# Altium footprint library Power_Lib_Altium.PcbLib: 383 footprints (part 23 of 24)
Each footprint in its own frame and in the unit in brackets; x right, y up, seen from the top. Pads: shape width x height; smd on the part's side, far side on the other; paste and mask are expansions set on the pad; w line width, h text height; cw(c..) or ccw(c..) is an arc to the next point about the centre after c.
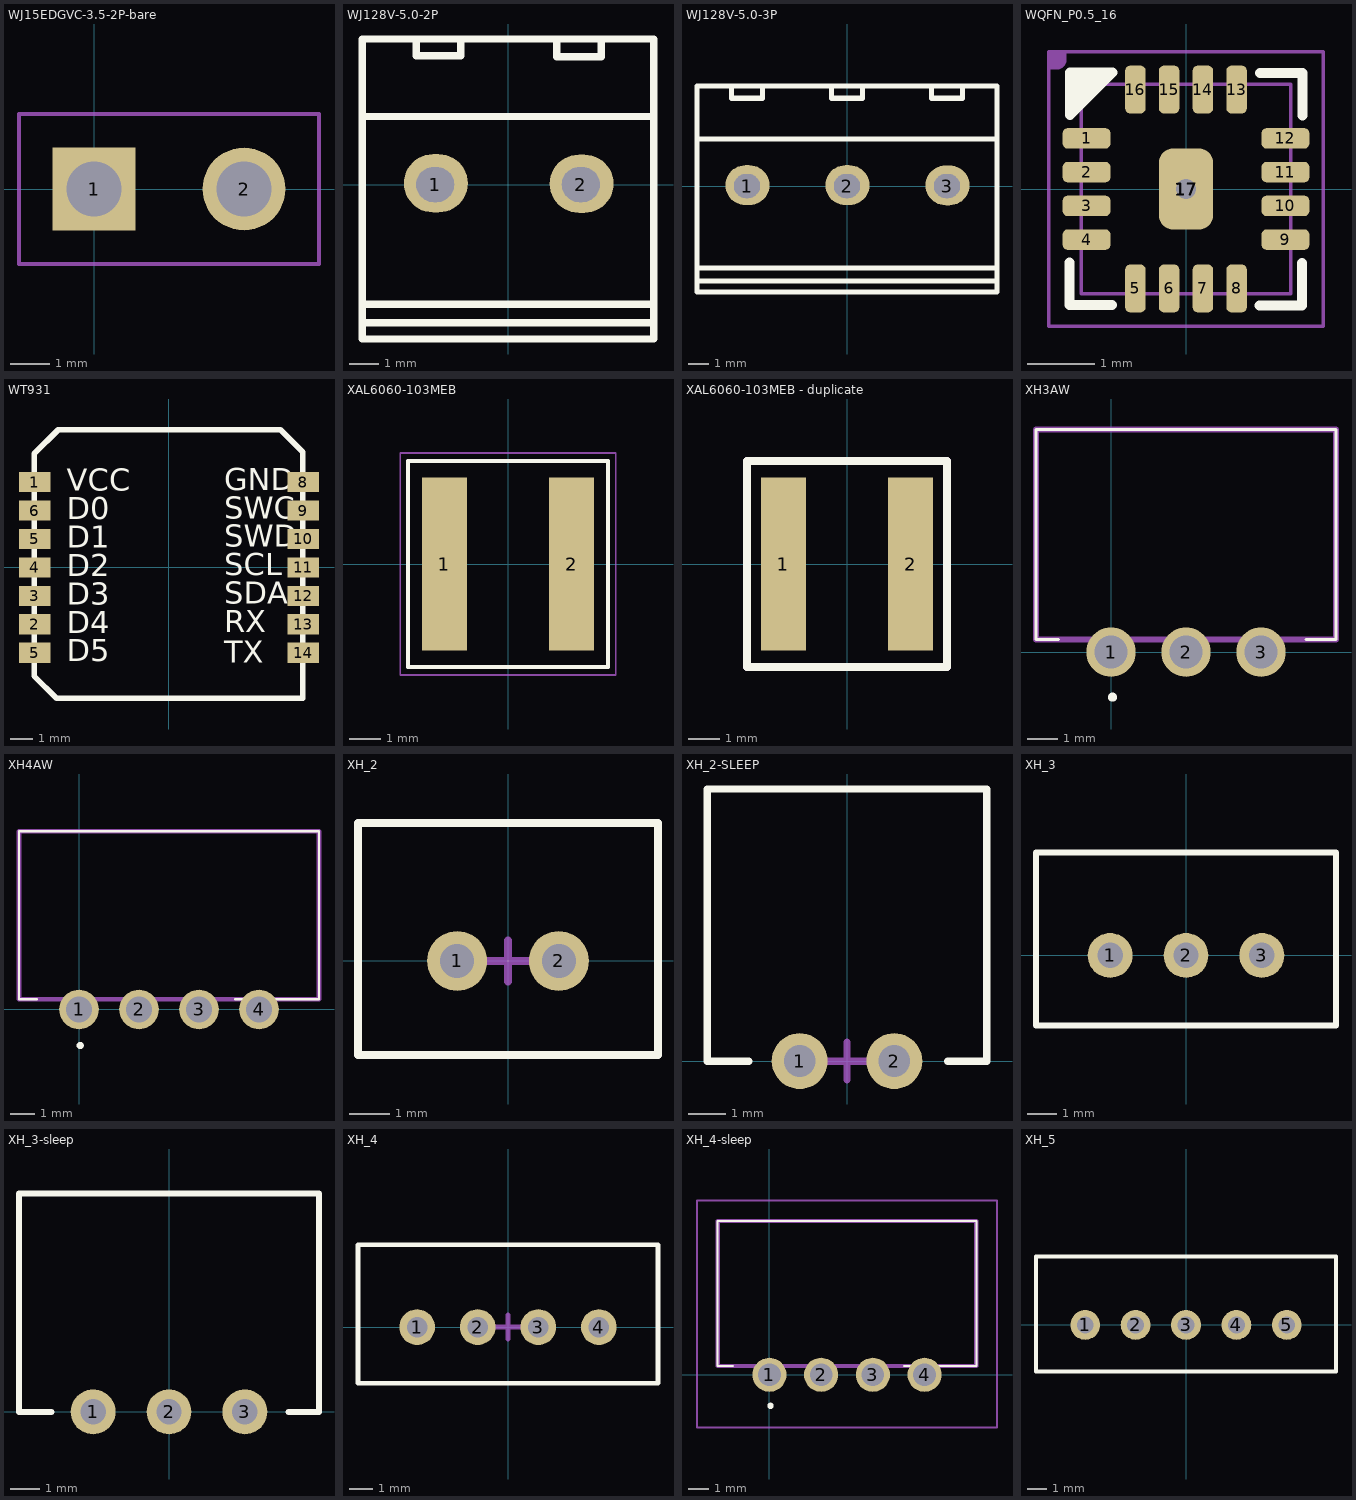
[diagram p22: the footprints below, top view; thin cyan lines are the x and y axes]

## WJ15EDGVC-3.5-2P-bare [mm]
pads (2):
  rect 2.1x2.1 hole 1.4: 1(0,0)
  round 2.1 hole 1.4: 2(3.81,0)
Mechanical 13:
  lines w0.1: -1.905,-1.905 5.715,-1.905 5.715,1.905 -1.905,1.905 -1.905,-1.905

## WJ128V-5.0-2P [mm]
pads (2):
  oval 2.2x2 hole 1.2 slot 1.3 at 0 deg copper offset 0.023,0.044: 1(-2.5,0)
  oval 2.2x2 hole 1.2 slot 1.3 at 0 deg copper offset 0.027,0.032: 2(2.5,0)
Top Overlay:
  lines w0.254: -5,-4.74 5,-4.74 ; -5,-4.11 5,-4.11 ; -5,2.34 5,2.34 ; -3.146,4.959 -3.146,4.419 -1.616,4.419 -1.616,4.959 ; 1.672,4.929 1.672,4.389 3.202,4.389 3.202,4.929 ; 5,-5.3 5,5 ; 5,-5.3 -5,-5.3 -5,5 5,5 ; 5,-5.3 5,5
3D body: height 0.25, standoff -20, extent 12.573,2.413 12.573,2.413
3D body: height 14.1, standoff 0, extent -5,-5.3 5,5
3D body: height 0.25, standoff -20, extent 12.573,2.413 12.573,2.413

## WJ128V-5.0-3P [mm]
pads (3):
  oval 2.2x2 hole 1.2 slot 1.3 at 0 deg copper offset 0.023,0.044: 1(-5,0) 2(0,0)
  oval 2.2x2 hole 1.2 slot 1.3 at 0 deg copper offset 0.027,0.032: 3(5,0)
Top Overlay:
  lines w0.254: -7.5,-4.11 7.5,-4.11 ; -7.5,2.34 7.5,2.34 ; -7.493,-4.74 7.5,-4.74 ; -5.765,4.929 -5.765,4.389 -4.235,4.389 -4.235,4.929 ; -0.765,4.929 -0.765,4.389 0.765,4.389 0.765,4.929 ; 4.235,4.929 4.235,4.389 5.765,4.389 5.765,4.929 ; 7.5,-5.3 7.5,5 ; 7.5,-5.3 -7.5,-5.3 -7.5,5 7.5,5 ; 7.5,-5.3 7.5,5
3D body: height 0.25, standoff -20, extent 15.073,2.413 15.073,2.413
3D body: height 14.1, standoff 0, extent -7.5,-5.3 7.5,5
3D body: height 0.25, standoff -20, extent 15.073,2.413 15.073,2.413

## WQFN_P0.5_16 [mil]
height 23.62
pads (18):
  rrect50% 28x12 smd: 1(-58,29.53) 2(-58,9.84) 3(-58,-9.84) 4(-58,-29.53) 9(58,-29.53) 10(58,-9.84) 11(58,9.84) 12(58,29.53)
  rrect50% 12x28 smd: 5(-29.53,-58) 6(-9.84,-58) 7(9.84,-58) 8(29.53,-58) 13(29.53,58) 14(9.84,58) 15(-9.84,58) 16(-29.53,58)
  rrect50% 31.5x47.24 smd: 17(0,0)
  round 15.75 hole 11.81: 17(0,0)
Top Overlay:
  region: -67.67,68 -43,68 -67.67,43.33
  lines w6: -68,-43 -68,-67.67 -43.33,-67.67 ; 43,-68 67.67,-68 67.67,-43.33 ; 43.33,67.67 68,67.67 68,43 ; -67.67,43.33 -67.67,68 -43,68 -67.67,43.33
Top Solder:
  rectangle: -72,-29.53 -44,29.53
  region: 29.53,-72 29.53,-44 -29.53,-44 -29.53,-72
  region: -29.53,72 -29.53,44 29.53,44 29.53,72
  region: 72,29.53 44,29.53 44,-29.53 72,-29.53
Mechanical 13:
  lines w2: -10,0 10,0 ; 0,-10 0,10 ; -61.02,-61.02 61.02,-61.02 61.02,61.02 -61.02,61.02 -61.02,-61.02
Mechanical 14:
  region: -80,80 -70,80 -70,75 -70,74.01 -70.76,72.17 -72.17,70.76 -74.01,70 -75,70 -80,70
  lines w2: -80,-80 -80,80 80,80 80,-80 -80,-80
3D body "QFN50P300X300X100-16N.step": height 39.37, standoff 0, extent -59.05,-59.05 59.06,59.06

## WT931 [mm]
pads (14):
  rect 1.4x0.9 smd: 1(-6,3.81) 2(-6,-2.54) 3(-6,-1.27) 4(-6,0) 5(-6,-3.81) 5(-6,1.27) 6(-6,2.54) 8(6,3.81) 9(6,2.54) 10(6,1.27) 11(6,0) 12(6,-1.27) 13(6,-2.54) 14(6,-3.81)
Top Overlay:
  lines w0.254: -6.025,-4.848 -5.025,-5.848 5.975,-5.848 5.975,5.152 4.975,6.152 -4.947,6.152 -6.025,5.074 -6.025,-4.848
  text "TX" at 2.468,-4.263 h1
  text "RX" at 2.468,-2.896 h1
  text "SDA" at 2.468,-1.626 h1
  text "SCL" at 2.468,-0.356 h1
  text "SWD" at 2.468,0.914 h1
  text "SWC" at 2.468,2.184 h1
  text "GND" at 2.468,3.454 h1
  text "D5" at -4.562,-4.202 h1
  text "D4" at -4.562,-2.932 h1
  text "D3" at -4.562,-1.662 h1
  text "D2" at -4.562,-0.392 h1
  text "D1" at -4.562,0.878 h1
  text "D0" at -4.562,2.148 h1
  text "VCC" at -4.562,3.418 h1
3D body: height 1.5, standoff 0, extent -5.985,-5.865 5.953,6.073

## XAL6060-103MEB [mm]
pads (2):
  rect 1.43x5.5 smd: 1(-2.02,0) 2(2.02,0)
Top Overlay:
  lines w0.127: -3.18,-3.28 3.18,-3.28 3.18,3.28 -3.18,3.28 -3.18,-3.28
Mechanical 13:
  lines w0.127: -3.18,-3.28 3.18,-3.28 3.18,3.28 -3.18,3.28 -3.18,-3.28
Mechanical 15:
  lines w0.05: -3.43,-3.53 -3.43,3.53 3.43,3.53 3.43,-3.53 -3.43,-3.53
3D body: height 6.1, standoff 0, extent -3.175,-3.264 3.175,3.264

## XAL6060-103MEB - duplicate [mm]
pads (2):
  rect 1.43x5.5 smd: 1(-2.02,0) 2(2.02,0)
Top Overlay:
  lines w0.254: -3.18,-3.28 -3.18,3.28 3.18,3.28 3.18,-3.28 -3.18,-3.28
Mechanical 13:
  lines w0.254: -3.18,-3.28 3.18,-3.28 3.18,3.28 -3.18,3.28 -3.18,-3.28

## XH3AW [mm]
pads (3):
  round 1.65 hole 1.1: 1(0,0) 2(2.5,0) 3(5,0)
Top Overlay:
  lines w0.1: -2.5,0.425 -2.5,7.425 ; -2.5,0.425 -2.5,7.425 ; -2.5,0.425 -1.75,0.425 -2.5,0.425 ; -2.5,7.425 7.5,7.425 ; -2.5,7.425 7.5,7.425 ; 7.5,0.425 6.5,0.425 7.5,0.425 ; 7.5,0.425 7.5,7.425 ; 7.5,0.425 7.5,7.425
  lines w0.2: 0,-1.5 ccw(c0.05,-1.5) 0.1,-1.5 ; 0,-1.5 cw(c0.05,-1.5) 0.1,-1.5 ; 0,-1.5 ccw(c0.05,-1.5) 0.1,-1.5
Mechanical 13:
  lines w0.2: -2.5,0.425 -2.5,7.425 7.5,7.425 7.5,0.425 -2.5,0.425
3D body "XH-3AW.stp": height 6, standoff -5, extent -2.5,-0.449 7.5,7.425

## XH4AW [mm]
pads (4):
  round 1.65 hole 1.1: 1(0,0) 2(2.5,0) 3(5,0) 4(7.5,0)
Top Overlay:
  lines w0.1: 8.75,0.425 6.5,0.425 10,0.425 10,7.425 -2.5,7.425 ; -2.5,0.425 -1.75,0.425 -2.5,0.425 ; -2.5,0.425 -2.5,7.425 ; -2.5,0.425 -2.5,7.425
  lines w0.2: 0,-1.5 ccw(c0.05,-1.5) 0.1,-1.5 ; 0,-1.5 cw(c0.05,-1.5) 0.1,-1.5 ; 0,-1.5 ccw(c0.05,-1.5) 0.1,-1.5
Mechanical 13:
  lines w0.2: -2.5,0.425 10,0.425 10,7.425 -2.5,7.425 -2.5,0.425
3D body "XH-3AW.stp": height 6, standoff -5, extent 0,-0.449 10,7.425
3D body "XH-3AW.stp": height 6, standoff -5, extent -2.5,-0.449 7.5,7.425

## XH_2 [mm]
pads (2):
  round 1.5 hole 0.85: 1(-1.27,0) 2(1.27,0)
Top Overlay:
  lines w0.2: -3.75,-2.35 3.75,-2.35 3.75,3.45 -3.75,3.45 -3.75,-2.35
Mechanical 15:
  lines w0.2: -0.508,0 0.508,0 ; 0,-0.508 0,0.508
3D body "XH_2.STEP": height 7.21, standoff -3.19, extent -3.75,-2.35 3.75,3.45

## XH_2-SLEEP [mm]
pads (2):
  round 1.5 hole 0.85: 1(-1.27,0) 2(1.27,0)
Top Overlay:
  lines w0.2: -3.75,0 -3.75,7.3 3.75,7.3 3.75,0 ; -3.7,0 -2.63,0 ; 2.7,0 3.7,0
Mechanical 15:
  lines w0.2: -0.508,0 0.508,0 ; 0,-0.508 0,0.508
3D body "JST-XH-2.5mm-2P.STEP": height 5.95, standoff -3.35, extent -3.75,-0.34 3.75,7.3

## XH_3 [mm]
pads (3):
  round 1.5 hole 0.85: 1(-2.54,0) 2(0,0) 3(2.54,0)
Top Overlay:
  lines w0.2: -5.02,-2.35 5.02,-2.35 5.02,3.45 -5.02,3.45 -5.02,-2.35
3D body "XH_3.STEP": height 7.21, standoff -3.19, extent -5.02,-2.35 5.02,3.45

## XH_3-sleep [mm]
pads (3):
  round 1.5 hole 0.85: 1(-2.54,0) 2(0,0) 3(2.54,0)
Top Overlay:
  lines w0.2: -5.02,0 -5.02,7.3 5.02,7.3 5.02,0 ; -5,0 -3.93,0 ; 4,0 5,0
3D body "JST-XH-2.5mm-3P.STEP": height 5.95, standoff -3.35, extent -5,-0.34 5,7.3

## XH_4 [mm]
pads (4):
  round 1.5 hole 0.85: 1(-3.81,0) 2(-1.27,0) 3(1.27,0) 4(3.81,0)
Top Overlay:
  lines w0.2: -6.29,-2.35 6.29,-2.35 6.29,3.45 -6.29,3.45 -6.29,-2.35
Mechanical 15:
  lines w0.2: -0.508,0 0.508,0 ; 0,-0.508 0,0.508
3D body "XH(middle).STEP": height 7.2, standoff -3.2, extent 0,-2.35 2.54,3.45
3D body "XH(middle).STEP": height 7.2, standoff -3.2, extent -2.54,-2.35 0,3.45
3D body "XH(right).STEP": height 7.2, standoff -3.2, extent 2.54,-2.35 6.29,3.45
3D body "XH(left).STEP": height 7.2, standoff -3.2, extent -6.29,-2.35 -2.54,3.45

## XH_4-sleep [mm]
pads (4):
  round 1.65 hole 1.1: 1(0,0) 2(2.5,0) 3(5,0) 4(7.5,0)
Top Overlay:
  lines w0.1: 8.75,0.425 6.5,0.425 10,0.425 10,7.425 -2.5,7.425 ; -2.5,0.425 -1.75,0.425 -2.5,0.425 ; -2.5,0.425 -2.5,7.425 ; -2.5,0.425 -2.5,7.425
  lines w0.2: 0,-1.5 ccw(c0.05,-1.5) 0.1,-1.5 ; 0,-1.5 cw(c0.05,-1.5) 0.1,-1.5 ; 0,-1.5 ccw(c0.05,-1.5) 0.1,-1.5
Mechanical 13:
  lines w0.2: -2.5,0.425 10,0.425 10,7.425 -2.5,7.425 -2.5,0.425
Mechanical 15:
  lines w0.1: -3.5,-2.55 11,-2.55 11,8.425 -3.5,8.425 -3.5,-2.55
3D body "JST-XH-2.5mm-3P.STEP": height 5.95, standoff -3.35, extent -0.04,-0.34 9.96,7.3
3D body "JST-XH-2.5mm-3P.STEP": height 5.95, standoff -3.35, extent -2.54,-0.34 7.46,7.3

## XH_5 [mm]
pads (5):
  round 1.5 hole 0.85: 1(-5.08,0) 2(-2.54,0) 3(0,0) 4(2.54,0) 5(5.08,0)
Top Overlay:
  lines w0.2: -7.56,-2.35 7.56,-2.35 7.56,3.45 -7.56,3.45 -7.56,-2.35
3D body "XH(middle).STEP": height 7.2, standoff -3.2, extent 1.27,-2.35 3.81,3.45
3D body "XH(middle).STEP": height 7.2, standoff -3.2, extent -1.27,-2.35 1.27,3.45
3D body "XH(middle).STEP": height 7.2, standoff -3.2, extent -3.81,-2.35 -1.27,3.45
3D body "XH(right).STEP": height 7.2, standoff -3.2, extent 3.81,-2.35 7.56,3.45
3D body "XH(left).STEP": height 7.2, standoff -3.2, extent -7.56,-2.35 -3.81,3.45